# Altium footprint library CPU_v1.PcbLib: 56 footprints (part 4 of 4)
Each footprint in its own frame and in the unit in brackets; x right, y up, seen from the top. Pads: shape width x height; smd on the part's side, far side on the other; paste and mask are expansions set on the pad; w line width, h text height; cw(c..) or ccw(c..) is an arc to the next point about the centre after c.
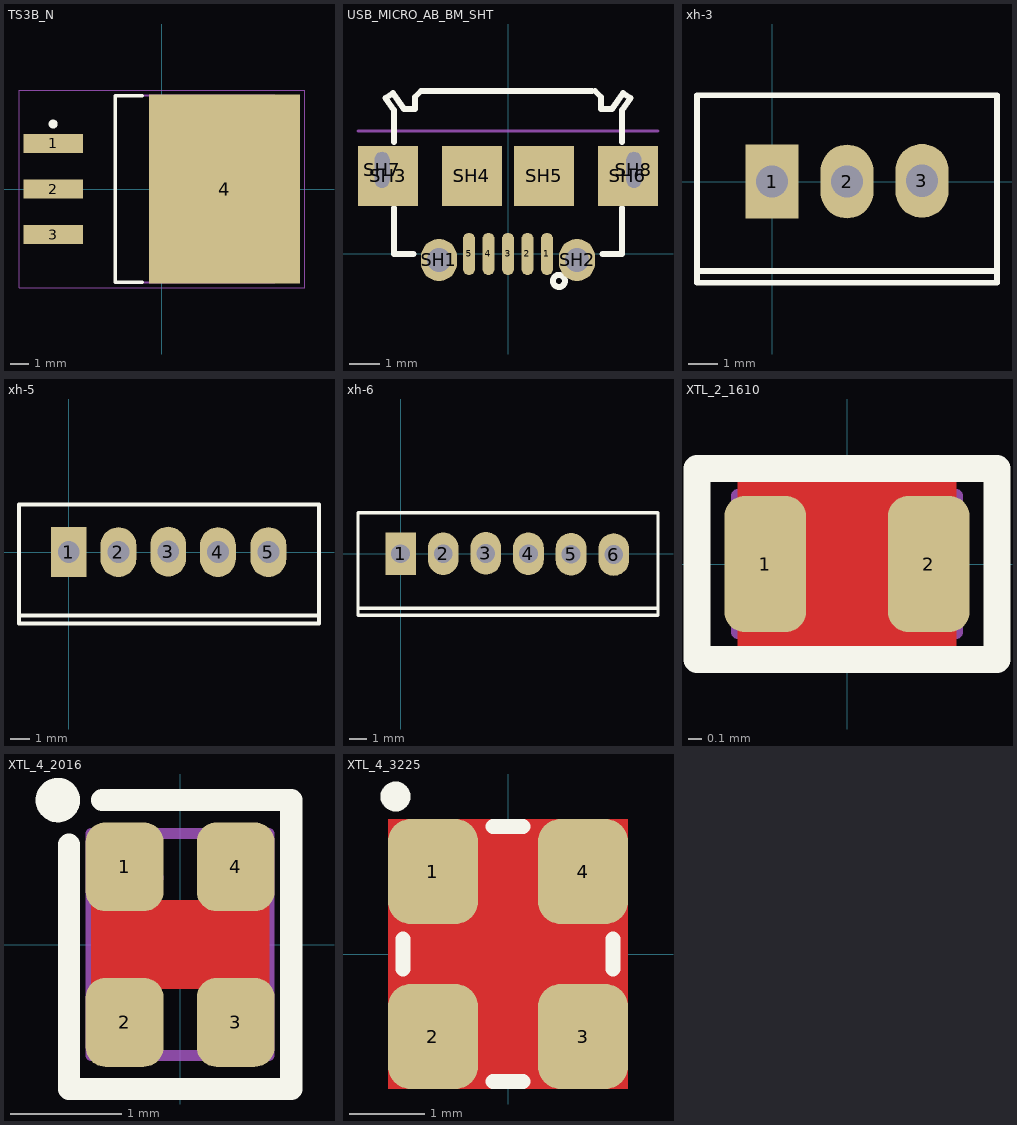
[diagram p3: the footprints below, top view; thin cyan lines are the x and y axes]

## TS3B_N [mm] "D2-PAK, 4-Leads, Body 8.6x10.2mm, Pitch 2.54mm, Lead Span 14.2mm, IPC Medium Density"
height 4.64
pads (4):
  rect 3.3x1.05 smd: 1(-6.05,2.54) 2(-6.05,0) 3(-6.05,-2.54)
  rect 8.4x10.5 smd: 4(3.5,0)
Top Overlay:
  circle w0.25: c-6.05,3.615 r0.125
  lines w0.2: -1.1,-5.2 -2.6,-5.2 -2.6,5.2 -1.1,5.2
Mechanical 13:
  lines w0.1: -2.6,-5.2 -2.6,5.2 6.29,5.2 6.29,-5.2 -2.6,-5.2
Mechanical 15:
  lines w0.05: -7.95,-5.5 -7.95,5.5 7.95,5.5 7.95,-5.5 -7.95,-5.5
  lines w0.1: -0.5,0 0.5,0 ; 0,-0.5 0,0.5
3D body: height 4.64, standoff 0, extent -2.6,-5.2 6.29,5.2

## USB_MICRO_AB_BM_SHT [mm] "CONN, USB Micro AB - Standard (Bottom mount), Shell THD, G610"
height 5.61
pads (13):
  oval 0.4x1.4 smd: 1(1.3,0) 2(0.65,0) 3(0,0) 4(-0.65,0) 5(-1.3,0)
  oval 1.2x1.4 hole 0.8 mask+0.05: SH1(-2.3,-0.2) SH2(2.3,-0.2)
  rect 2x2 smd paste-0.2: SH3(-4,2.6) SH4(-1.2,2.6) SH5(1.2,2.6) SH6(4,2.6)
  oval 0.8x1.6 hole 0.5 slot 1.2 at 90 deg: SH7(-4.2,2.8) SH8(4.2,2.8)
Top Overlay:
  circle w0.2: c1.7,-0.9 r0.2
  lines w0.2: -3.8,1.53 -3.8,0 -3.15,0 ; -3.8,3.73 -3.8,4.791 -4.078,5.192 -3.831,5.363 -3.462,4.83 -3.1,4.83 -3.1,5.23 -2.9,5.43 2.8,5.43 ; 2.9,5.43 3.1,5.23 3.1,4.83 3.462,4.83 3.831,5.363 4.078,5.192 3.8,4.791 3.8,3.73 ; 3.15,0 3.8,0 3.8,1.53 3.8,1.03
Mechanical 1:
  lines w0.1: -5,4.092 5,4.092
  text "PCB EDGE" at -2.7,4.4 h0.8
3D body "475890001.stp": height 2.76, standoff -0.58, extent -4.325,-0.369 4.325,5.425

## xh-3 [mm]
height 11.6
pads (3):
  rect 1.8x2.5 hole 1.1: 1(0,0)
  oval 1.8x2.5 hole 1.1: 2(2.54,0) 3(5.08,0.023)
Top Overlay:
  lines w0.2: -2.54,-3.029 7.62,-3.029 ; -2.54,-3.429 -2.54,2.921 7.62,2.921 7.62,-3.429 -2.54,-3.429
3D body "SW3dPS-XH-A-3.STEP": height 7, standoff -3.4, extent -2.41,-3.306 7.49,2.794

## xh-5 [mm]
height 2.25
pads (5):
  rect 1.8x2.5 hole 1.1: 1(0,0)
  oval 1.8x2.5 hole 1.1: 2(2.5,0) 3(5,0.023) 4(7.5,0) 5(10.04,0)
Top Overlay:
  lines w0.2: -2.5,-3.2 12.58,-3.2 ; -2.5,-3.6 -2.5,2.4 12.58,2.4 12.58,-3.6 -2.5,-3.6
3D body "JST 5pin.stp": height 7.14, standoff -3.45, extent -2.375,-3.607 12.535,2.299

## xh-6 [mm] "6 Pin XH Connector P=2.5mm"
height 4.3
pads (6):
  rect 1.8x2.5 hole 1.1: 1(0,0)
  oval 1.8x2.5 hole 1.1: 2(2.5,0) 3(5,0.023) 4(7.5,0) 5(10,-0.023) 6(12.5,-0.046)
Top Overlay:
  lines w0.2: -2.5,-3.2 15.1,-3.2 ; -2.5,-3.6 15.1,-3.6 15.1,2.4 -2.5,2.4 -2.5,-3.6
3D body "SW3dPS-jst-b6b-xh-a.STEP": height 7, standoff -3.4, extent -2.4,-3.45 15,2.3

## XTL_2_1610 [mm] "Crystals 1.6 mm x 1.0 mm"
height 0.5
pads (2):
  rrect50% 0.6x1 smd mask+0.1: 1(-0.6,0) 2(0.6,0)
Top Layer:
  pour cut-out: -0.8,-0.6 0.8,-0.6 0.8,0.6 -0.8,0.6
Top Overlay:
  lines w0.2: -1.1,-0.7 1.1,-0.7 1.1,0.7 -1.1,0.7 -1.1,-0.7
Mechanical 13:
  lines w0.1: -0.8,-0.5 0.8,-0.5 0.8,0.5 -0.8,0.5 -0.8,-0.5
3D body "ABS05.STEP": height 0.5, standoff 0, extent -0.8,-0.5 0.8,0.5

## XTL_4_2016 [mm] "ABM11"
height 0.7
pads (4):
  rrect50% 0.7x0.8 smd mask+0.075: 1(-0.5,0.7) 2(-0.5,-0.7) 3(0.5,-0.7) 4(0.5,0.7)
Top Layer:
  pour cut-out: -0.8,0.4 -0.8,-0.4 0.8,-0.4 0.8,0.4
Top Overlay:
  circle w0.2: c-1.1,1.3 r0.1
  lines w0.2: -1,0.9 -1,-1.3 1,-1.3 1,1.3 -0.7,1.3
Mechanical 13:
  circle w0.1: c-0.4,0.6 r0.2
  lines w0.1: -0.8,-1 -0.8,1 0.8,1 0.8,-1 -0.8,-1
3D body "XTL_4_200X160-XRCGB27M000F2P00R0.step": height 0.65, standoff 0, extent -0.8,-1 0.8,1

## XTL_4_3225 [mm] "CRYSTAL OSCILATOR 3.2X2.5mm, ABM8, CDFN-4"
pads (4):
  rrect50% 1.2x1.4 smd: 1(-1,1.1) 2(-1,-1.1) 3(1,-1.1) 4(1,1.1)
Top Layer:
  pour cut-out: -1.6,1.8 -1.6,-1.8 1.6,-1.8 1.6,1.8
Top Overlay:
  circle w0.2: c-1.5,2.1 r0.1
  lines w0.2: -1.4,-0.2 -1.4,0.2 ; -0.2,-1.7 0.2,-1.7 ; -0.2,1.7 0.2,1.7 ; 1.4,-0.2 1.4,0.2
Mechanical 13:
  circle w0.1: c-0.8,1.1 r0.3
  lines w0.1: -1.3,-1.6 -1.3,1.6 1.3,1.6 1.3,-1.6 -1.3,-1.6
3D body "User Library-3225-1.step": height 0.61, standoff 0, extent -1.25,-1.6 1.25,1.6